# Altium footprint library ICs And Semiconductors SMD.PcbLib: 943 footprints (part 44 of 60)
Each footprint in its own frame and in the unit in brackets; x right, y up, seen from the top. Pads: shape width x height; smd on the part's side, far side on the other; paste and mask are expansions set on the pad; w line width, h text height; cw(c..) or ccw(c..) is an arc to the next point about the centre after c.
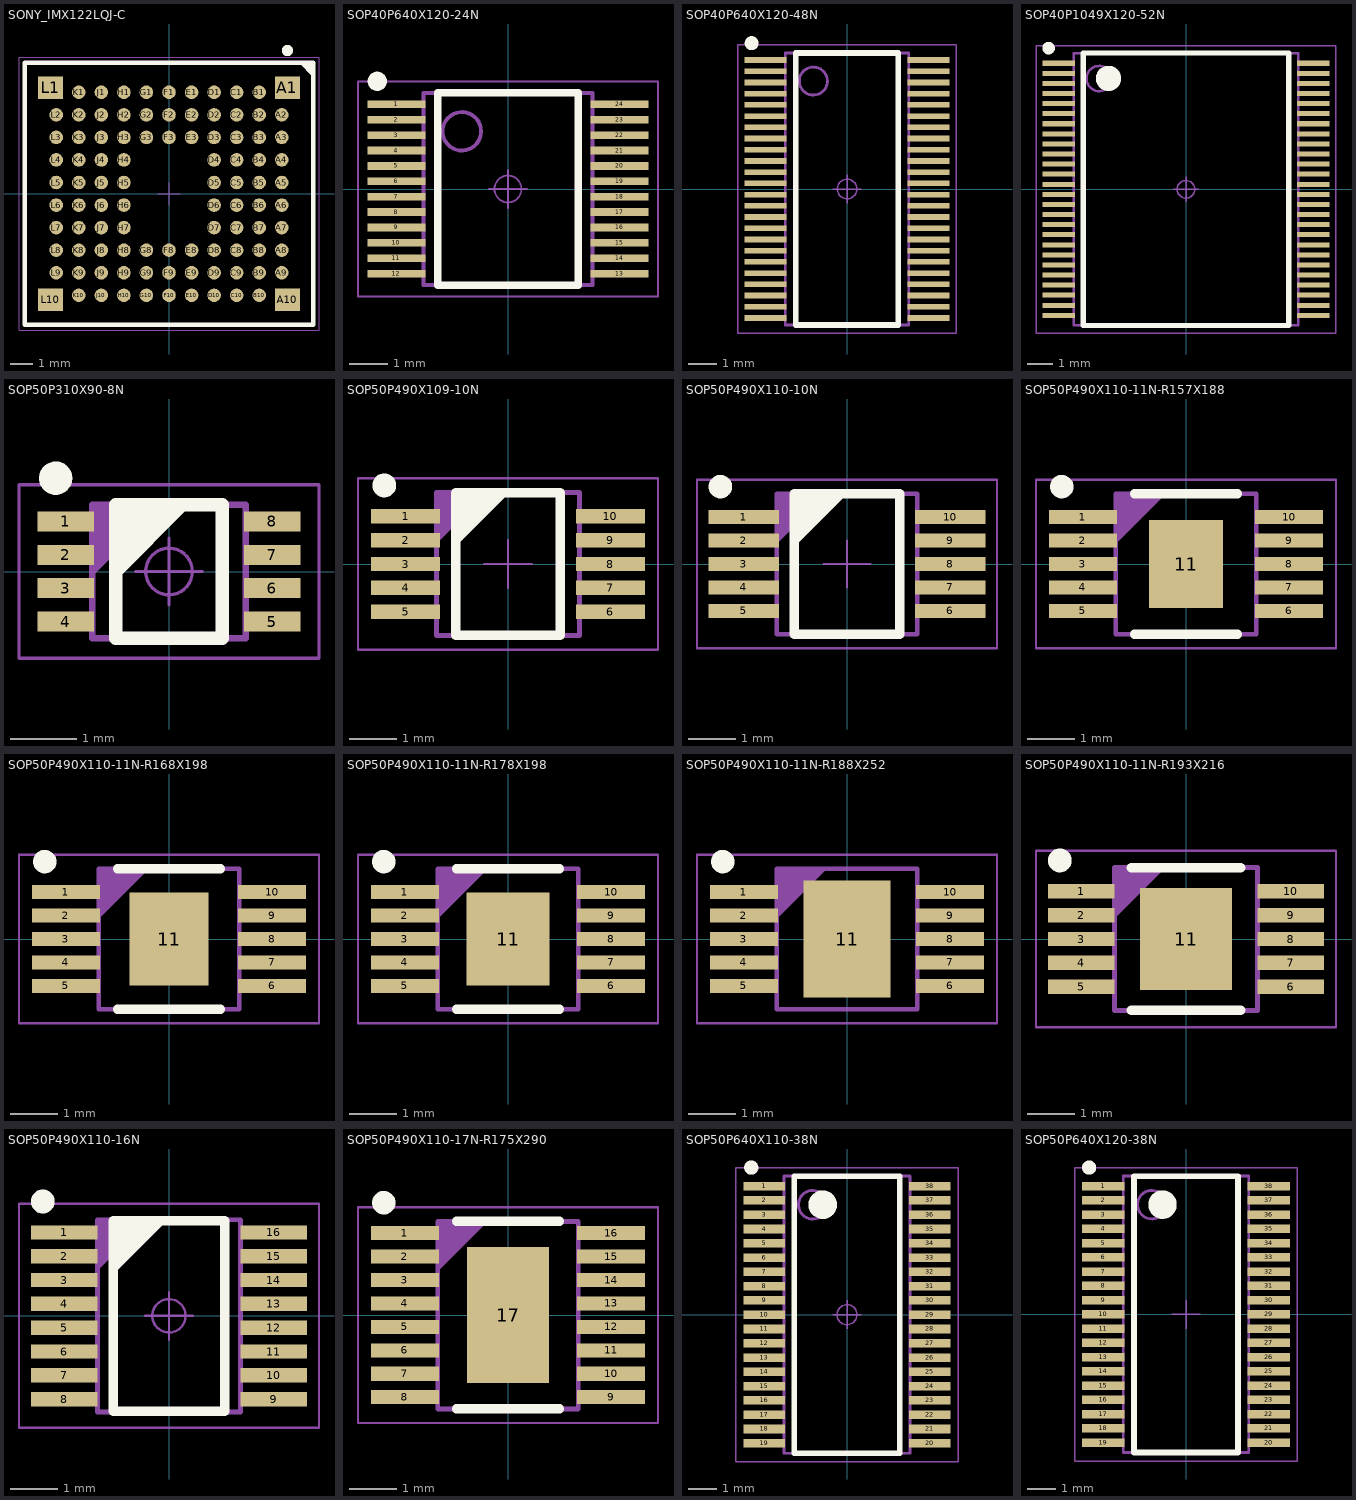
[diagram p43: the footprints below, top view; thin cyan lines are the x and y axes]

## SONY_IMX122LQJ-C [mm] "LGA, 94-Leads, Body 12.80x11.60mmx2.15mm, Pitch 1.00mm"
height 2.15
pads (98):
  rect 1.1x1 smd: A1(5.25,4.7) A10(5.25,-4.7) L1(-5.25,4.7) L10(-5.25,-4.7)
  round 0.6 smd: A2(5,3.5) A3(5,2.5) A4(5,1.5) A5(5,0.5) A6(5,-0.5) A7(5,-1.5) A8(5,-2.5) A9(5,-3.5) B1(4,4.5) B2(4,3.5) B3(4,2.5) B4(4,1.5) B5(4,0.5) B6(4,-0.5) B7(4,-1.5) B8(4,-2.5) B9(4,-3.5) B10(4,-4.5) C1(3,4.5) C2(3,3.5) C3(3,2.5) C4(3,1.5) C5(3,0.5) C6(3,-0.5) C7(3,-1.5) C8(3,-2.5) C9(3,-3.5) C10(3,-4.5) D1(2,4.5) D2(2,3.5) D3(2,2.5) D4(2,1.5) D5(2,0.5) D6(2,-0.5) D7(2,-1.5) D8(2,-2.5) D9(2,-3.5) D10(2,-4.5) E1(1,4.5) E2(1,3.5) E3(1,2.5) E8(1,-2.5) E9(1,-3.5) E10(1,-4.5) F1(0,4.5) F2(0,3.5) F3(0,2.5) F8(0,-2.5) F9(0,-3.5) F10(0,-4.5) G1(-1,4.5) G2(-1,3.5) G3(-1,2.5) G8(-1,-2.5) G9(-1,-3.5) G10(-1,-4.5) H1(-2,4.5) H2(-2,3.5) H3(-2,2.5) H4(-2,1.5) H5(-2,0.5) H6(-2,-0.5) H7(-2,-1.5) H8(-2,-2.5) H9(-2,-3.5) H10(-2,-4.5) J1(-3,4.5) J2(-3,3.5) J3(-3,2.5) J4(-3,1.5) J5(-3,0.5) J6(-3,-0.5) J7(-3,-1.5) J8(-3,-2.5) J9(-3,-3.5) J10(-3,-4.5) K1(-4,4.5) K2(-4,3.5) K3(-4,2.5) K4(-4,1.5) K5(-4,0.5) K6(-4,-0.5) K7(-4,-1.5) K8(-4,-2.5) K9(-4,-3.5) K10(-4,-4.5) L2(-5,3.5) L3(-5,2.5) L4(-5,1.5) L5(-5,0.5) L6(-5,-0.5) L7(-5,-1.5) L8(-5,-2.5) L9(-5,-3.5)
Top Overlay:
  circle w0.25: c5.25,6.35 r0.125
  lines w0.2: 5.9,5.8 6.4,5.3 ; 6.1,5.8 6.4,5.5 ; -6.4,-5.8 6.4,-5.8 6.4,5.8 -6.4,5.8 -6.4,-5.8
Mechanical 14:
  lines w0.1: -6.4,-5.8 6.4,-5.8 6.4,5.8 -6.4,5.8 -6.4,-5.8
  text "10" at 5.475,-4.75 h0.5
  text "9" at 5.725,-3.75 h0.5
  text "8" at 5.725,-2.75 h0.5
  text "7" at 5.725,-1.75 h0.5
  text "6" at 5.725,-0.75 h0.5
  text "5" at 5.725,0.25 h0.5
  text "4" at 5.725,1.25 h0.5
  text "3" at 5.725,2.25 h0.5
  text "1" at 5.725,4.25 h0.5
  text "2" at 5.725,3.25 h0.5
  text "L" at -5.15,5 h0.5
  text "K" at -4.175,5 h0.5
  text "J" at -3.125,5 h0.5
  text "H" at -2.175,5 h0.5
  text "G" at -1.175,5 h0.5
  text "F" at -0.15,5 h0.5
  text "E" at 0.85,5 h0.5
  text "D" at 1.825,5 h0.5
  text "C" at 2.825,5 h0.5
  text "B" at 3.825,5 h0.5
  text "A" at 4.8,5 h0.5
Mechanical 15:
  lines w0.05: -0.5,0 0.5,0 ; 0,-0.5 0,0.5 ; -6.65,-6.05 6.65,-6.05 6.65,6.05 -6.65,6.05 -6.65,-6.05
3D body "IMX122LQJ-C.stp": height 2.15, standoff 0, extent -6.45,-5.85 6.45,5.85

## SOP40P640X120-24N [mm] "SOP, 0.40mm Pitch; 24 pin, 4.40mm W X 5.00mm L X 1.20mm H Body, IPC Medium Density"
height 1.2
pads (24):
  rect 1.5x0.2 smd: 1(-2.9,2.2) 2(-2.9,1.8) 3(-2.9,1.4) 4(-2.9,1) 5(-2.9,0.6) 6(-2.9,0.2) 7(-2.9,-0.2) 8(-2.9,-0.6) 9(-2.9,-1) 10(-2.9,-1.4) 11(-2.9,-1.8) 12(-2.9,-2.2) 13(2.9,-2.2) 14(2.9,-1.8) 15(2.9,-1.4) 16(2.9,-1) 17(2.9,-0.6) 18(2.9,-0.2) 19(2.9,0.2) 20(2.9,0.6) 21(2.9,1) 22(2.9,1.4) 23(2.9,1.8) 24(2.9,2.2)
Top Overlay:
  circle w0.25: c-3.4,2.8 r0.125
  lines w0.2: -1.825,-2.5 1.825,-2.5 1.825,2.5 -1.825,2.5 -1.825,-2.5
Mechanical 14:
  circle w0.1: c-1.2,1.5 r0.5
  lines w0.1: -2.2,-2.5 2.2,-2.5 2.2,2.5 -2.2,2.5 -2.2,-2.5
Mechanical 15:
  circle w0.05: c0,0 r0.35
  lines w0.05: -0.5,0 0.5,0 ; 0,-0.5 0,0.5 ; -3.9,-2.8 3.9,-2.8 3.9,2.8 -3.9,2.8 -3.9,-2.8
3D body "SOP40P640X120-24N.stp": height 1.2, standoff 0, extent -3.3,-2.5 3.3,2.5

## SOP40P640X120-48N [mm] "SOP, 0.40mm Pitch; 48 Pin, 4.40mm W X 9.70mm L X 1.20mm H Body, IPC Medium Density"
height 1.2
pads (48):
  rect 1.5x0.2 smd: 1(-2.9,4.6) 2(-2.9,4.2) 3(-2.9,3.8) 4(-2.9,3.4) 5(-2.9,3) 6(-2.9,2.6) 7(-2.9,2.2) 8(-2.9,1.8) 9(-2.9,1.4) 10(-2.9,1) 11(-2.9,0.6) 12(-2.9,0.2) 13(-2.9,-0.2) 14(-2.9,-0.6) 15(-2.9,-1) 16(-2.9,-1.4) 17(-2.9,-1.8) 18(-2.9,-2.2) 19(-2.9,-2.6) 20(-2.9,-3) 21(-2.9,-3.4) 22(-2.9,-3.8) 23(-2.9,-4.2) 24(-2.9,-4.6) 25(2.9,-4.6) 26(2.9,-4.2) 27(2.9,-3.8) 28(2.9,-3.4) 29(2.9,-3) 30(2.9,-2.6) 31(2.9,-2.2) 32(2.9,-1.8) 33(2.9,-1.4) 34(2.9,-1) 35(2.9,-0.6) 36(2.9,-0.2) 37(2.9,0.2) 38(2.9,0.6) 39(2.9,1) 40(2.9,1.4) 41(2.9,1.8) 42(2.9,2.2) 43(2.9,2.6) 44(2.9,3) 45(2.9,3.4) 46(2.9,3.8) 47(2.9,4.2) 48(2.9,4.6)
Top Overlay:
  circle w0.25: c-3.4,5.2 r0.125
  lines w0.2: -1.825,-4.85 1.825,-4.85 1.825,4.85 -1.825,4.85 -1.825,-4.85
Mechanical 14:
  circle w0.1: c-1.2,3.85 r0.5
  lines w0.1: -2.2,-4.85 2.2,-4.85 2.2,4.85 -2.2,4.85 -2.2,-4.85
Mechanical 15:
  circle w0.05: c0,0 r0.35
  lines w0.05: -0.5,0 0.5,0 ; 0,-0.5 0,0.5 ; -3.9,-5.15 3.9,-5.15 3.9,5.15 -3.9,5.15 -3.9,-5.15
3D body "SOP40P640X120-48N.stp": height 1.2, standoff 0, extent -3.3,-4.85 3.3,4.85

## SOP40P1049X120-52N [mm] "SOP, 0.40mm Pitch; 52 Pin, 8.89mm W X 10.79mm L X 1.20mm H Body, IPC Medium Density"
height 1.2
pads (52):
  rect 1.3x0.2 smd: 1(-5.05,5) 2(-5.05,4.6) 3(-5.05,4.2) 4(-5.05,3.8) 5(-5.05,3.4) 6(-5.05,3) 7(-5.05,2.6) 8(-5.05,2.2) 9(-5.05,1.8) 10(-5.05,1.4) 11(-5.05,1) 12(-5.05,0.6) 13(-5.05,0.2) 14(-5.05,-0.2) 15(-5.05,-0.6) 16(-5.05,-1) 17(-5.05,-1.4) 18(-5.05,-1.8) 19(-5.05,-2.2) 20(-5.05,-2.6) 21(-5.05,-3) 22(-5.05,-3.4) 23(-5.05,-3.8) 24(-5.05,-4.2) 25(-5.05,-4.6) 26(-5.05,-5) 27(5.05,-5) 28(5.05,-4.6) 29(5.05,-4.2) 30(5.05,-3.8) 31(5.05,-3.4) 32(5.05,-3) 33(5.05,-2.6) 34(5.05,-2.2) 35(5.05,-1.8) 36(5.05,-1.4) 37(5.05,-1) 38(5.05,-0.6) 39(5.05,-0.2) 40(5.05,0.2) 41(5.05,0.6) 42(5.05,1) 43(5.05,1.4) 44(5.05,1.8) 45(5.05,2.2) 46(5.05,2.6) 47(5.05,3) 48(5.05,3.4) 49(5.05,3.8) 50(5.05,4.2) 51(5.05,4.6) 52(5.05,5)
Top Overlay:
  circle w0.5: c-3.075,4.4 r0.25
  circle w0.25: c-5.45,5.6 r0.125
  lines w0.2: -4.075,-5.4 4.075,-5.4 4.075,5.4 -4.075,5.4 -4.075,-5.4
Mechanical 14:
  circle w0.1: c-3.445,4.395 r0.5
  lines w0.1: -4.445,-5.395 4.445,-5.395 4.445,5.395 -4.445,5.395 -4.445,-5.395
Mechanical 15:
  circle w0.05: c0,0 r0.35
  lines w0.05: -0.5,0 0.5,0 ; 0,-0.5 0,0.5 ; -5.95,-5.7 5.95,-5.7 5.95,5.7 -5.95,5.7 -5.95,-5.7
3D body "SOP40P1049X120-52N.stp": height 1.2, standoff 0, extent -5.256,-5.395 5.256,5.395

## SOP50P310X90-8N [mm] "SOP, 0.50mm pitch; 8 pin, 2.30mm W X 2.00mm L X 0.90mm H body, PC Medium Density"
height 0.9
pads (8):
  rect 0.85x0.3 smd: 1(-1.55,0.75) 2(-1.55,0.25) 3(-1.55,-0.25) 4(-1.55,-0.75) 5(1.55,-0.75) 6(1.55,-0.25) 7(1.55,0.25) 8(1.55,0.75)
Top Overlay:
  circle w0.25: c-1.7,1.4 r0.125
  lines w0.2: -0.8,0 0.2,1 ; -0.8,0.2 0,1 ; -0.8,0.4 -0.2,1 ; -0.8,0.6 -0.4,1 ; -0.8,0.8 -0.6,1 ; -0.8,-1 0.8,-1 0.8,1 -0.8,1 -0.8,-1
Mechanical 14:
  lines w0.1: -1.15,0 -0.15,1 ; -1.15,0.1 -0.25,1 ; -1.15,0.2 -0.35,1 ; -1.15,0.3 -0.45,1 ; -1.15,0.4 -0.55,1 ; -1.15,0.5 -0.65,1 ; -1.15,0.6 -0.75,1 ; -1.15,0.7 -0.85,1 ; -1.15,0.8 -0.95,1 ; -1.15,0.9 -1.05,1 ; -1.15,-1 1.15,-1 1.15,1 -1.15,1 -1.15,-1
Mechanical 15:
  circle w0.05: c0,0 r0.35
  lines w0.05: -0.5,0 0.5,0 ; 0,-0.5 0,0.5 ; -2.25,-1.3 2.25,-1.3 2.25,1.3 -2.25,1.3 -2.25,-1.3
3D body "SOP50P310X90-8N.stp": height 0.9, standoff 0, extent -1.616,-1 1.616,1

## SOP50P490X109-10N [mm] "MSOP, 10-Leads, Body 3.1x3.1mm (max), Pitch 0.50mm, IPC Medium Density"
height 1.09
pads (10):
  rect 1.45x0.3 smd: 1(-2.15,1) 2(-2.15,0.5) 3(-2.15,0) 4(-2.15,-0.5) 5(-2.15,-1) 6(2.15,-1) 7(2.15,-0.5) 8(2.15,0) 9(2.15,0.5) 10(2.15,1)
Top Overlay:
  circle w0.25: c-2.6,1.65 r0.125
  lines w0.2: -1.1,0.5 -0.1,1.5 ; -1.1,0.7 -0.3,1.5 ; -1.1,0.9 -0.5,1.5 ; -1.1,1.1 -0.7,1.5 ; -1.1,1.3 -0.9,1.5 ; -1.1,-1.5 1.1,-1.5 1.1,1.5 -1.1,1.5 -1.1,-1.5
Mechanical 14:
  lines w0.1: -1.5,0.5 -0.5,1.5 ; -1.5,0.6 -0.6,1.5 ; -1.5,0.7 -0.7,1.5 ; -1.5,0.8 -0.8,1.5 ; -1.5,0.9 -0.9,1.5 ; -1.5,1 -1,1.5 ; -1.5,1.1 -1.1,1.5 ; -1.5,1.2 -1.2,1.5 ; -1.5,1.3 -1.3,1.5 ; -1.5,1.4 -1.4,1.5 ; -1.5,-1.5 1.5,-1.5 1.5,1.5 -1.5,1.5 -1.5,-1.5
Mechanical 15:
  lines w0.05: -0.5,0 0.5,0 ; 0,-0.5 0,0.5 ; -3.15,-1.8 -3.15,1.8 3.15,1.8 3.15,-1.8 -3.15,-1.8
3D body "SOP50P490X109-10N.stp": height 1.09, standoff 0, extent -2.45,-1.55 2.45,1.55

## SOP50P490X110-10N [mm] "MSOP, 10-Leads, Body 3.1x3.1mm (max), Pitch 0.50mm, IPC Medium Density"
height 1.1
pads (10):
  rect 1.5x0.3 smd: 1(-2.2,1) 2(-2.2,0.5) 3(-2.2,0) 4(-2.2,-0.5) 5(-2.2,-1) 6(2.2,-1) 7(2.2,-0.5) 8(2.2,0) 9(2.2,0.5) 10(2.2,1)
Top Overlay:
  circle w0.25: c-2.7,1.65 r0.125
  lines w0.2: -1.125,0.5 -0.125,1.5 ; -1.125,0.7 -0.325,1.5 ; -1.125,0.9 -0.525,1.5 ; -1.125,1.1 -0.725,1.5 ; -1.125,1.3 -0.925,1.5 ; -1.125,-1.5 -1.125,1.5 1.125,1.5 1.125,-1.5 -1.125,-1.5
Mechanical 14:
  lines w0.1: -1.5,0.5 -0.5,1.5 ; -1.5,0.6 -0.6,1.5 ; -1.5,0.7 -0.7,1.5 ; -1.5,0.8 -0.8,1.5 ; -1.5,0.9 -0.9,1.5 ; -1.5,1 -1,1.5 ; -1.5,1.1 -1.1,1.5 ; -1.5,1.2 -1.2,1.5 ; -1.5,1.3 -1.3,1.5 ; -1.5,1.4 -1.4,1.5 ; -1.5,-1.5 -1.5,1.5 1.5,1.5 1.5,-1.5 -1.5,-1.5
Mechanical 15:
  lines w0.05: -0.5,0 0.5,0 ; 0,-0.5 0,0.5 ; -3.2,-1.8 3.2,-1.8 3.2,1.8 -3.2,1.8 -3.2,-1.8
3D body "SOP50P490X110-10N.stp": height 1.1, standoff 0, extent -2.45,-1.55 2.45,1.55

## SOP50P490X110-11N-R157X188 [mm] "SOP, 0.50mm, pitch; 10 pin, 3.00mm W X 3.00mm L X 1.10mm H body (w/thermal tab  1.57 X 1.88 mm), IPC Medium Density"
height 1.1
pads (11):
  rect 1.45x0.3 smd: 1(-2.2,1) 2(-2.2,0.5) 3(-2.2,0) 4(-2.2,-0.5) 5(-2.2,-1) 6(2.2,-1) 7(2.2,-0.5) 8(2.2,0) 9(2.2,0.5) 10(2.2,1)
  rect 1.57x1.88 smd: 11(0,0)
Top Overlay:
  circle w0.25: c-2.65,1.65 r0.125
  lines w0.2: -1.1,-1.5 1.1,-1.5 ; -1.1,1.5 1.1,1.5
Mechanical 14:
  lines w0.1: -1.5,0.5 -0.5,1.5 ; -1.5,0.6 -0.6,1.5 ; -1.5,0.7 -0.7,1.5 ; -1.5,0.8 -0.8,1.5 ; -1.5,0.9 -0.9,1.5 ; -1.5,1 -1,1.5 ; -1.5,1.1 -1.1,1.5 ; -1.5,1.2 -1.2,1.5 ; -1.5,1.3 -1.3,1.5 ; -1.5,1.4 -1.4,1.5 ; -1.5,-1.5 -1.5,1.5 1.5,1.5 1.5,-1.5 -1.5,-1.5
Mechanical 15:
  circle w0.05: c0,0 r0.35
  lines w0.05: -0.5,0 0.5,0 ; 0,-0.5 0,0.5 ; -3.2,-1.8 3.2,-1.8 3.2,1.8 -3.2,1.8 -3.2,-1.8
3D body "SOP50P490X110-11N-R155X185.stp": height 1.1, standoff 0, extent -2.45,-1.55 2.45,1.55

## SOP50P490X110-11N-R168X198 [mm] "SOP, 0.50mm, Pitch; 10 pin, 3.00mm W X 3.00mm L X 1.10mm H body (w/thermal tab  1.68 X 1.98 mm), IPC Medium Density"
height 1.1
pads (11):
  rect 1.45x0.3 smd: 1(-2.2,1) 2(-2.2,0.5) 3(-2.2,0) 4(-2.2,-0.5) 5(-2.2,-1) 6(2.2,-1) 7(2.2,-0.5) 8(2.2,0) 9(2.2,0.5) 10(2.2,1)
  rect 1.68x1.98 smd: 11(0,0)
Top Overlay:
  circle w0.25: c-2.65,1.65 r0.125
  lines w0.2: -1.1,-1.5 1.1,-1.5 ; -1.1,1.5 1.1,1.5
Mechanical 14:
  lines w0.1: -1.5,0.5 -0.5,1.5 ; -1.5,0.6 -0.6,1.5 ; -1.5,0.7 -0.7,1.5 ; -1.5,0.8 -0.8,1.5 ; -1.5,0.9 -0.9,1.5 ; -1.5,1 -1,1.5 ; -1.5,1.1 -1.1,1.5 ; -1.5,1.2 -1.2,1.5 ; -1.5,1.3 -1.3,1.5 ; -1.5,1.4 -1.4,1.5 ; -1.5,-1.5 1.5,-1.5 1.5,1.5 -1.5,1.5 -1.5,-1.5
Mechanical 15:
  circle w0.05: c0,0 r0.35
  lines w0.05: -0.5,0 0.5,0 ; 0,-0.5 0,0.5 ; -3.2,-1.8 -3.2,1.8 3.2,1.8 3.2,-1.8 -3.2,-1.8
3D body "SOP50P490X110-11N-R168X198.stp": height 1.1, standoff 0, extent -2.45,-1.55 2.45,1.55

## SOP50P490X110-11N-R178X198 [mm] "SOP, 0.50mm, Pitch; 10 pin, 3.00mm W X 3.00mm L X 1.10mm H body (w/thermal tab  1.78 X 1.98 mm), IPC Medium Density"
height 1.1
pads (11):
  rect 1.45x0.3 smd: 1(-2.2,1) 2(-2.2,0.5) 3(-2.2,0) 4(-2.2,-0.5) 5(-2.2,-1) 6(2.2,-1) 7(2.2,-0.5) 8(2.2,0) 9(2.2,0.5) 10(2.2,1)
  rect 1.78x1.98 smd: 11(0,0)
Top Overlay:
  circle w0.25: c-2.65,1.65 r0.125
  lines w0.2: -1.1,-1.5 1.1,-1.5 ; -1.1,1.5 1.1,1.5
Mechanical 14:
  lines w0.1: -1.5,0.5 -0.5,1.5 ; -1.5,0.6 -0.6,1.5 ; -1.5,0.7 -0.7,1.5 ; -1.5,0.8 -0.8,1.5 ; -1.5,0.9 -0.9,1.5 ; -1.5,1 -1,1.5 ; -1.5,1.1 -1.1,1.5 ; -1.5,1.2 -1.2,1.5 ; -1.5,1.3 -1.3,1.5 ; -1.5,1.4 -1.4,1.5 ; -1.5,-1.5 1.5,-1.5 1.5,1.5 -1.5,1.5 -1.5,-1.5
Mechanical 15:
  circle w0.05: c0,0 r0.35
  lines w0.05: -0.5,0 0.5,0 ; 0,-0.5 0,0.5 ; -3.2,-1.8 -3.2,1.8 3.2,1.8 3.2,-1.8 -3.2,-1.8
3D body "SOP50P490X110-11N-R178X198.stp": height 1.1, standoff 0, extent -2.45,-1.55 2.45,1.55

## SOP50P490X110-11N-R188X252 [mm] "SOP, 0.50mm, Pitch; 10 Pin, 3.00mm W X 3.00mm L X 1.10mm H Body (w/Thermal Tab  1.88 X 2.52 mm), IPC Medium Density"
height 1.1
pads (11):
  rect 1.45x0.3 smd: 1(-2.2,1) 2(-2.2,0.5) 3(-2.2,0) 4(-2.2,-0.5) 5(-2.2,-1) 6(2.2,-1) 7(2.2,-0.5) 8(2.2,0) 9(2.2,0.5) 10(2.2,1)
  rect 1.85x2.5 smd paste-0.39: 11(0,0)
Top Overlay:
  circle w0.25: c-2.65,1.65 r0.125
Mechanical 14:
  lines w0.1: -1.5,0.5 -0.5,1.5 ; -1.5,0.6 -0.6,1.5 ; -1.5,0.7 -0.7,1.5 ; -1.5,0.8 -0.8,1.5 ; -1.5,0.9 -0.9,1.5 ; -1.5,1 -1,1.5 ; -1.5,1.1 -1.1,1.5 ; -1.5,1.2 -1.2,1.5 ; -1.5,1.3 -1.3,1.5 ; -1.5,1.4 -1.4,1.5 ; -1.5,-1.5 1.5,-1.5 1.5,1.5 -1.5,1.5 -1.5,-1.5
Mechanical 15:
  circle w0.05: c0,0 r0.35
  lines w0.05: -0.5,0 0.5,0 ; 0,-0.5 0,0.5 ; -3.2,-1.8 -3.2,1.8 3.2,1.8 3.2,-1.8 -3.2,-1.8
3D body "SOP50P490X110-11N-R188X252.stp": height 1.1, standoff 0, extent -2.45,-1.55 2.45,1.55

## SOP50P490X110-11N-R193X216 [mm] "SOP, 0.50mm, Pitch; 10 Pin, 3.00mm W X 3.00mm L X 1.10mm H Body (w/Thermal Tab  1.93 X 2.16 mm), IPC Medium Density"
height 1.1
pads (11):
  rect 1.4x0.3 smd: 1(-2.2,1) 2(-2.2,0.5) 3(-2.2,0) 4(-2.2,-0.5) 5(-2.2,-1) 6(2.2,-1) 7(2.2,-0.5) 8(2.2,0) 9(2.2,0.5) 10(2.2,1)
  rect 1.93x2.15 smd: 11(0,0)
Top Overlay:
  circle w0.25: c-2.65,1.65 r0.125
  lines w0.2: -1.15,-1.5 1.15,-1.5 ; -1.15,1.5 1.15,1.5
Mechanical 14:
  lines w0.1: -1.5,0.5 -0.5,1.5 ; -1.5,0.6 -0.6,1.5 ; -1.5,0.7 -0.7,1.5 ; -1.5,0.8 -0.8,1.5 ; -1.5,0.9 -0.9,1.5 ; -1.5,1 -1,1.5 ; -1.5,1.1 -1.1,1.5 ; -1.5,1.2 -1.2,1.5 ; -1.5,1.3 -1.3,1.5 ; -1.5,1.4 -1.4,1.5 ; -1.5,-1.5 1.5,-1.5 1.5,1.5 -1.5,1.5 -1.5,-1.5
Mechanical 15:
  circle w0.05: c0,0 r0.35
  lines w0.05: -0.5,0 0.5,0 ; 0,-0.5 0,0.5 ; -3.15,-1.85 -3.15,1.85 3.15,1.85 3.15,-1.85 -3.15,-1.85
3D body "SOP50P490X110-11N-R193X216.stp": height 1.1, standoff 0, extent -2.45,-1.55 2.45,1.55

## SOP50P490X110-16N [mm] "SOP, 0.50mm Pitch; 16 Pin, 3.00mm W X 4.039mm L X 1.10mm H Body, IPC Medium Density"
height 1.1
pads (16):
  rect 1.4x0.3 smd: 1(-2.2,1.75) 2(-2.2,1.25) 3(-2.2,0.75) 4(-2.2,0.25) 5(-2.2,-0.25) 6(-2.2,-0.75) 7(-2.2,-1.25) 8(-2.2,-1.75) 9(2.2,-1.75) 10(2.2,-1.25) 11(2.2,-0.75) 12(2.2,-0.25) 13(2.2,0.25) 14(2.2,0.75) 15(2.2,1.25) 16(2.2,1.75)
Top Overlay:
  circle w0.25: c-2.65,2.4 r0.125
  lines w0.2: -1.175,1 -0.175,2 ; -1.175,1.2 -0.375,2 ; -1.175,1.4 -0.575,2 ; -1.175,1.6 -0.775,2 ; -1.175,1.8 -0.975,2 ; -1.175,-2 -1.175,2 1.175,2 1.175,-2 -1.175,-2
Mechanical 14:
  lines w0.1: -1.5,1.019 -0.5,2.019 ; -1.5,1.12 -0.6,2.019 ; -1.5,1.219 -0.7,2.019 ; -1.5,1.32 -0.8,2.019 ; -1.5,1.419 -0.9,2.019 ; -1.5,1.519 -1,2.019 ; -1.5,1.62 -1.1,2.019 ; -1.5,1.719 -1.2,2.019 ; -1.5,1.82 -1.3,2.019 ; -1.5,1.919 -1.4,2.019 ; -1.5,-2.019 -1.5,2.019 1.5,2.019 1.5,-2.019 -1.5,-2.019
Mechanical 15:
  circle w0.05: c0,0 r0.35
  lines w0.05: -0.5,0 0.5,0 ; 0,-0.5 0,0.5 ; -3.15,-2.35 -3.15,2.35 3.15,2.35 3.15,-2.35 -3.15,-2.35
3D body "SOP50P490X110-16N.stp": height 1.1, standoff 0, extent -2.466,-2.07 2.466,2.07

## SOP50P490X110-17N-R175X290 [mm] "MSOP16, Pitch 0.5mm - Body 3x4mm, (w/thermal tab 1.75mm X 2.9mm), IPC Medium Density"
height 1.1
pads (17):
  rect 1.45x0.3 smd: 1(-2.2,1.75) 2(-2.2,1.25) 3(-2.2,0.75) 4(-2.2,0.25) 5(-2.2,-0.25) 6(-2.2,-0.75) 7(-2.2,-1.25) 8(-2.2,-1.75) 9(2.2,-1.75) 10(2.2,-1.25) 11(2.2,-0.75) 12(2.2,-0.25) 13(2.2,0.25) 14(2.2,0.75) 15(2.2,1.25) 16(2.2,1.75)
  rect 1.75x2.9 smd paste-0.395: 17(0,0)
Top Overlay:
  circle w0.25: c-2.65,2.4 r0.125
  lines w0.2: -1.1,-2 1.1,-2 ; -1.1,2 1.1,2
Mechanical 14:
  lines w0.1: -1.5,1 -0.5,2 ; -1.5,1.1 -0.6,2 ; -1.5,1.2 -0.7,2 ; -1.5,1.3 -0.8,2 ; -1.5,1.4 -0.9,2 ; -1.5,1.5 -1,2 ; -1.5,1.6 -1.1,2 ; -1.5,1.7 -1.2,2 ; -1.5,1.8 -1.3,2 ; -1.5,1.9 -1.4,2 ; -1.5,-2 1.5,-2 1.5,2 -1.5,2 -1.5,-2
Mechanical 15:
  circle w0.05: c0,0 r0.35
  lines w0.05: -0.5,0 0.5,0 ; 0,-0.5 0,0.5 ; -3.2,-2.3 3.2,-2.3 3.2,2.3 -3.2,2.3 -3.2,-2.3
3D body "SOP50P490X110-17N-R175X290.stp": height 1.1, standoff 0, extent -2.466,-2.07 2.466,2.07

## SOP50P640X110-38N [mm] "SOP, 0.50mm Pitch; 38 Pin, 4.40mm W X 9.70mm L X 1.10mm H Body, IPC Medium Density"
height 1.1
pads (38):
  rect 1.45x0.3 smd: 1(-2.9,4.5) 2(-2.9,4) 3(-2.9,3.5) 4(-2.9,3) 5(-2.9,2.5) 6(-2.9,2) 7(-2.9,1.5) 8(-2.9,1) 9(-2.9,0.5) 10(-2.9,0) 11(-2.9,-0.5) 12(-2.9,-1) 13(-2.9,-1.5) 14(-2.9,-2) 15(-2.9,-2.5) 16(-2.9,-3) 17(-2.9,-3.5) 18(-2.9,-4) 19(-2.9,-4.5) 20(2.9,-4.5) 21(2.9,-4) 22(2.9,-3.5) 23(2.9,-3) 24(2.9,-2.5) 25(2.9,-2) 26(2.9,-1.5) 27(2.9,-1) 28(2.9,-0.5) 29(2.9,0) 30(2.9,0.5) 31(2.9,1) 32(2.9,1.5) 33(2.9,2) 34(2.9,2.5) 35(2.9,3) 36(2.9,3.5) 37(2.9,4) 38(2.9,4.5)
Top Overlay:
  circle w0.25: c-3.35,5.15 r0.125
  circle w0.5: c-0.85,3.85 r0.25
  lines w0.2: -1.85,-4.85 -1.85,4.85 1.85,4.85 1.85,-4.85 -1.85,-4.85
Mechanical 14:
  circle w0.1: c-1.2,3.85 r0.5
  lines w0.1: -2.2,-4.85 -2.2,4.85 2.2,4.85 2.2,-4.85 -2.2,-4.85
Mechanical 15:
  circle w0.05: c0,0 r0.35
  lines w0.05: -0.5,0 0.5,0 ; 0,-0.5 0,0.5 ; -3.9,-5.15 -3.9,5.15 3.9,5.15 3.9,-5.15 -3.9,-5.15
3D body "SOP50P640X110-38N.stp": height 1.1, standoff 0, extent -3.319,-4.9 3.32,4.9

## SOP50P640X120-38N [mm] "SOP, 0.50mm pitch; 38 pin, 4.40mm W X 9.70mm L X 1.20mm H body, IPC Medium Density"
height 1.2
pads (38):
  rect 1.5x0.3 smd: 1(-2.9,4.5) 2(-2.9,4) 3(-2.9,3.5) 4(-2.9,3) 5(-2.9,2.5) 6(-2.9,2) 7(-2.9,1.5) 8(-2.9,1) 9(-2.9,0.5) 10(-2.9,0) 11(-2.9,-0.5) 12(-2.9,-1) 13(-2.9,-1.5) 14(-2.9,-2) 15(-2.9,-2.5) 16(-2.9,-3) 17(-2.9,-3.5) 18(-2.9,-4) 19(-2.9,-4.5) 20(2.9,-4.5) 21(2.9,-4) 22(2.9,-3.5) 23(2.9,-3) 24(2.9,-2.5) 25(2.9,-2) 26(2.9,-1.5) 27(2.9,-1) 28(2.9,-0.5) 29(2.9,0) 30(2.9,0.5) 31(2.9,1) 32(2.9,1.5) 33(2.9,2) 34(2.9,2.5) 35(2.9,3) 36(2.9,3.5) 37(2.9,4) 38(2.9,4.5)
Top Overlay:
  circle w0.25: c-3.4,5.15 r0.125
  circle w0.5: c-0.825,3.85 r0.25
  lines w0.2: -1.825,-4.85 -1.825,4.85 1.825,4.85 1.825,-4.85 -1.825,-4.85
Mechanical 14:
  circle w0.1: c-1.2,3.85 r0.5
  lines w0.1: -2.2,-4.85 -2.2,4.85 2.2,4.85 2.2,-4.85 -2.2,-4.85
Mechanical 15:
  lines w0.05: -0.5,0 0.5,0 ; 0,-0.5 0,0.5 ; -3.9,-5.15 -3.9,5.15 3.9,5.15 3.9,-5.15 -3.9,-5.15
3D body "SOP50P640X120-38N.stp": height 1.2, standoff 0, extent -3.32,-4.9 3.32,4.9